# Altium footprint library spider.PcbLib: 53 footprints (part 4 of 4)
Each footprint in its own frame and in the unit in brackets; x right, y up, seen from the top. Pads: shape width x height; smd on the part's side, far side on the other; paste and mask are expansions set on the pad; w line width, h text height; cw(c..) or ccw(c..) is an arc to the next point about the centre after c.
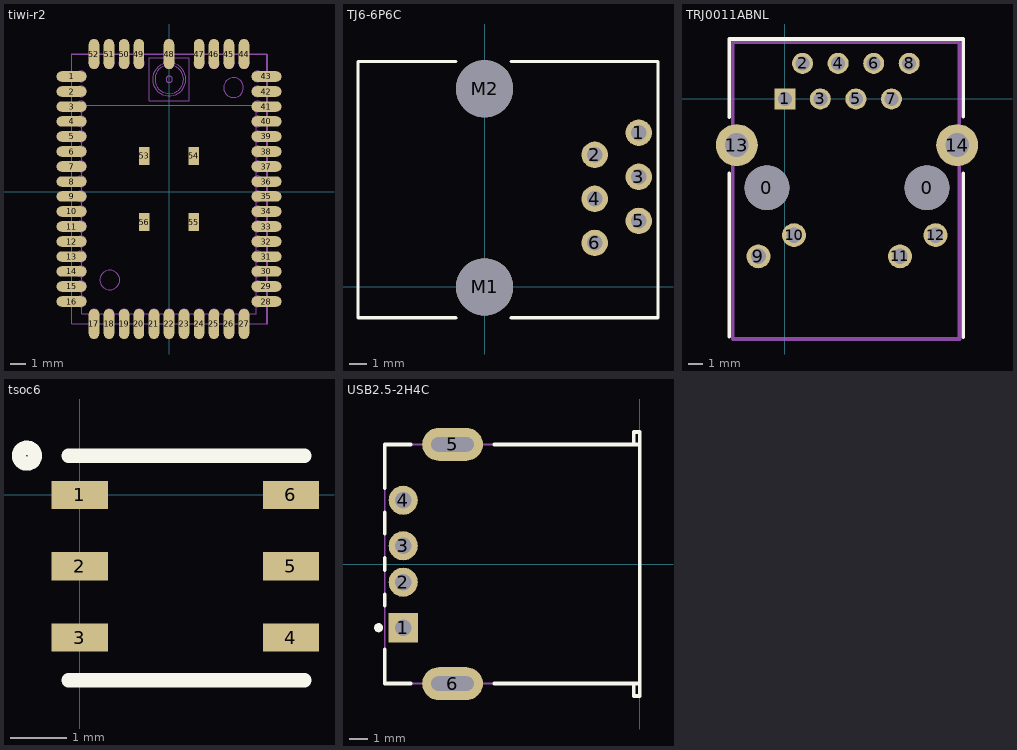
[diagram p3: the footprints below, top view; thin cyan lines are the x and y axes]

## tiwi-r2 [mm]
pads (56):
  oval 2x0.7 smd: 1(-6.533,7.688) 2(-6.533,6.688) 3(-6.533,5.688) 4(-6.533,4.688) 5(-6.533,3.688) 6(-6.533,2.688) 7(-6.533,1.688) 8(-6.533,0.688) 9(-6.533,-0.312) 10(-6.533,-1.312) 11(-6.533,-2.312) 12(-6.533,-3.312) 13(-6.533,-4.312) 14(-6.533,-5.312) 15(-6.533,-6.312) 16(-6.533,-7.312) 28(6.467,-7.312) 29(6.467,-6.312) 30(6.467,-5.312) 31(6.467,-4.312) 32(6.467,-3.312) 33(6.467,-2.312) 34(6.467,-1.312) 35(6.467,-0.312) 36(6.467,0.688) 37(6.467,1.688) 38(6.467,2.688) 39(6.467,3.688) 40(6.467,4.688) 41(6.467,5.688) 42(6.467,6.688) 43(6.467,7.688)
  oval 0.7x2 smd: 17(-5.033,-8.812) 18(-4.033,-8.812) 19(-3.033,-8.812) 20(-2.033,-8.812) 21(-1.033,-8.812) 22(-0.033,-8.812) 23(0.967,-8.812) 24(1.967,-8.812) 25(2.967,-8.812) 26(3.967,-8.812) 27(4.967,-8.812) 44(4.967,9.188) 45(3.967,9.188) 46(2.967,9.188) 47(1.967,9.188) 48(-0.033,9.188) 49(-2.033,9.188) 50(-3.033,9.188) 51(-4.033,9.188) 52(-5.033,9.188)
  rect 0.7x1.2 smd: 53(-1.683,2.388) 54(1.617,2.388) 55(1.617,-2.012) 56(-1.683,-2.012)
Mechanical 1:
  circle w0.025: c-0.017,7.501 r1.111
  circle w0.025: c-0.017,7.501 r0.953
  circle w0.025: c-0.017,7.501 r0.213
  lines w0.025: -6.533,-7.576 ccw(c-6.533,-7.322) -6.533,-7.068 ; -6.533,-6.576 ccw(c-6.533,-6.322) -6.533,-6.068 ; -6.533,-5.576 ccw(c-6.533,-5.322) -6.533,-5.068 ; -6.533,-4.576 ccw(c-6.533,-4.322) -6.533,-4.068 ; -6.533,-3.576 ccw(c-6.533,-3.322) -6.533,-3.068 ; -6.533,-2.576 ccw(c-6.533,-2.322) -6.533,-2.068 ; -6.533,-1.576 ccw(c-6.533,-1.322) -6.533,-1.068 ; -6.533,-0.576 ccw(c-6.533,-0.322) -6.533,-0.068 ; -6.533,0.424 ccw(c-6.533,0.678) -6.533,0.932 ; -6.533,1.424 ccw(c-6.533,1.678) -6.533,1.932 ; -6.533,2.424 ccw(c-6.533,2.678) -6.533,2.932 ; -6.533,3.424 ccw(c-6.533,3.678) -6.533,3.932 ; -6.533,4.424 ccw(c-6.533,4.678) -6.533,4.932 ; -6.533,5.424 ccw(c-6.533,5.678) -6.533,5.932 ; -6.533,6.424 ccw(c-6.533,6.678) -6.533,6.932 ; -6.533,7.424 ccw(c-6.533,7.678) -6.533,7.932 ; -5.297,9.188 ccw(c-5.043,9.188) -4.789,9.188 ; -5.277,-8.812 cw(c-5.023,-8.812) -4.769,-8.812 ; -4.297,9.188 ccw(c-4.043,9.188) -3.789,9.188 ; -4.277,-8.812 cw(c-4.023,-8.812) -3.769,-8.812 ; -3.297,9.188 ccw(c-3.043,9.188) -2.789,9.188 ; -3.277,-8.812 cw(c-3.023,-8.812) -2.769,-8.812 ; -2.297,9.188 ccw(c-2.043,9.188) -1.789,9.188 ; -2.277,-8.812 cw(c-2.023,-8.812) -1.769,-8.812 ; -1.277,-8.812 cw(c-1.023,-8.812) -0.769,-8.812 ; -0.297,9.188 ccw(c-0.043,9.188) 0.211,9.188 ; -0.277,-8.812 cw(c-0.023,-8.812) 0.231,-8.812 ; 0.723,-8.812 cw(c0.977,-8.812) 1.231,-8.812 ; 1.703,9.188 ccw(c1.957,9.188) 2.211,9.188 ; 1.723,-8.812 cw(c1.977,-8.812) 2.231,-8.812 ; 2.703,9.188 ccw(c2.957,9.188) 3.211,9.188 ; 2.723,-8.812 cw(c2.977,-8.812) 3.231,-8.812 ; 3.703,9.188 ccw(c3.957,9.188) 4.211,9.188 ; 3.723,-8.812 cw(c3.977,-8.812) 4.231,-8.812 ; 4.703,9.188 ccw(c4.957,9.188) 5.211,9.188 ; 4.723,-8.812 cw(c4.977,-8.812) 5.231,-8.812 ; 6.567,-7.556 cw(c6.567,-7.302) 6.567,-7.048 ; 6.567,-6.556 cw(c6.567,-6.302) 6.567,-6.048 ; 6.567,-5.556 cw(c6.567,-5.302) 6.567,-5.048 ; 6.567,-4.556 cw(c6.567,-4.302) 6.567,-4.048 ; 6.567,-3.556 cw(c6.567,-3.302) 6.567,-3.048 ; 6.567,-2.556 cw(c6.567,-2.302) 6.567,-2.048 ; 6.567,-1.556 cw(c6.567,-1.302) 6.567,-1.048 ; 6.567,-0.556 cw(c6.567,-0.302) 6.567,-0.048 ; 6.567,0.444 cw(c6.567,0.698) 6.567,0.952 ; 6.567,1.444 cw(c6.567,1.698) 6.567,1.952 ; 6.567,2.444 cw(c6.567,2.698) 6.567,2.952 ; 6.567,3.444 cw(c6.567,3.698) 6.567,3.952 ; 6.567,4.444 cw(c6.567,4.698) 6.567,4.952 ; 6.567,5.444 cw(c6.567,5.698) 6.567,5.952 ; 6.567,6.444 cw(c6.567,6.698) 6.567,6.952 ; 6.567,7.444 cw(c6.567,7.698) 6.567,7.952 ; -6.533,-8.812 6.567,-8.812 6.567,9.188 -6.533,9.188 -6.533,-8.812 ; -5.833,-8.112 5.767,-8.112 5.767,5.788 -5.833,5.788 -5.833,-8.112 ; -1.351,6.072 1.316,6.072 1.316,8.93 -1.351,8.93 -1.351,6.072
  text "MOD1" at 1.286,-0.082 h0.64
Mechanical 10:
  circle w0.025: c-4.023,8.582 r0.356
  circle w0.025: c-5.023,8.582 r0.356
  circle w0.025: c-4.023,-8.178 r0.356
  circle w0.025: c-5.023,-8.178 r0.356
  circle w0.025: c5.857,6.702 r0.356
  circle w0.025: c5.857,4.702 r0.356
  circle w0.025: c5.857,2.702 r0.356
  circle w0.025: c5.857,0.702 r0.356
  circle w0.025: c5.857,-1.298 r0.356
  circle w0.025: c5.857,-3.298 r0.356
  circle w0.025: c5.857,-5.298 r0.356
  circle w0.025: c5.857,-7.298 r0.356
  circle w0.025: c-5.903,-6.298 r0.356
  circle w0.025: c-5.903,-7.298 r0.356
  circle w0.025: c4.272,6.95 r0.66
  circle w0.025: c-3.983,-5.877 r0.66
  circle w0.025: c-5.903,-5.298 r0.356
  circle w0.025: c-5.903,-4.298 r0.356
  circle w0.025: c-5.903,-3.298 r0.356
  circle w0.025: c-5.903,-2.298 r0.356
  circle w0.025: c-5.903,-1.298 r0.356
  circle w0.025: c-5.903,-0.298 r0.356
  circle w0.025: c-5.903,0.702 r0.356
  circle w0.025: c-5.903,1.702 r0.356
  circle w0.025: c-5.903,2.702 r0.356
  circle w0.025: c-5.903,3.702 r0.356
  circle w0.025: c-5.903,4.702 r0.356
  circle w0.025: c-5.903,5.702 r0.356
  circle w0.025: c-5.903,6.702 r0.356
  circle w0.025: c-5.903,7.702 r0.356
  circle w0.025: c5.857,-6.298 r0.356
  circle w0.025: c5.857,-4.298 r0.356
  circle w0.025: c5.857,-2.298 r0.356
  circle w0.025: c5.857,-0.298 r0.356
  circle w0.025: c5.857,1.702 r0.356
  circle w0.025: c5.857,3.702 r0.356
  circle w0.025: c5.857,5.702 r0.356
  circle w0.025: c5.857,7.702 r0.356
  circle w0.025: c-3.023,-8.178 r0.356
  circle w0.025: c-2.023,-8.178 r0.356
  circle w0.025: c-1.023,-8.178 r0.356
  circle w0.025: c-0.023,-8.178 r0.356
  circle w0.025: c0.977,-8.178 r0.356
  circle w0.025: c1.977,-8.178 r0.356
  circle w0.025: c2.977,-8.178 r0.356
  circle w0.025: c3.977,-8.178 r0.356
  circle w0.025: c4.977,-8.178 r0.356
  circle w0.025: c-3.023,8.582 r0.356
  circle w0.025: c-2.023,8.582 r0.356
  circle w0.025: c-0.023,8.582 r0.356
  circle w0.025: c1.977,8.582 r0.356
  circle w0.025: c2.977,8.582 r0.356
  circle w0.025: c3.977,8.582 r0.356
  circle w0.025: c4.977,8.582 r0.356
  lines w0.025: -6.523,-8.798 -6.523,9.202 6.477,9.202 6.477,-8.798 -6.523,-8.798
Mechanical 18:
  lines w0.025: -6.533,-8.812 6.567,-8.812 6.567,9.188 -6.533,9.188 -6.533,-8.812
3D body: height 0.5, standoff 0, extent -6.533,-8.812 6.567,9.188
3D body "tiwi-r2.stp": height 1.87, standoff 0.08, extent -6.483,-8.812 6.517,9.188
3D body: height 1.9, standoff 0, extent -1.042,6.502 0.95,8.498
3D body: height 1.73, standoff 0.5, extent -5.833,-8.112 5.767,5.788

## TJ6-6P6C [mm]
pads (8):
  round 1.524 hole 0.9: 1(8.89,8.89) 2(6.35,7.62) 3(8.89,6.35) 4(6.35,5.08) 5(8.89,3.81) 6(6.35,2.54)
  round 3.3 hole 3.3 unplated: M1(0,0) M2(0,11.43)
Top Overlay:
  lines w0.2: -1.651,-1.778 -1.658,-1.785 -7.3,-1.785 -7.3,13 -1.651,13 ; 1.524,-1.778 1.531,-1.785 10,-1.785 10,13 1.524,13
3D body "User Library-RJ12_54601-906WPLF.STEP": height 11.55, standoff -3.7, extent -7.984,-0.885 10.016,12.315

## TRJ0011ABNL [mm] "TRJ0011ABNL RJ-45 magnet"
height 13.97
pads (16):
  round 3.2 hole 3.2 unplated: 0(-1.27,-6.35) 0(10.16,-6.35)
  rect 1.5x1.5 hole 1: 1(0,0)
  round 1.5 hole 1: 2(1.27,2.54) 3(2.54,0) 4(3.81,2.54) 5(5.08,0) 6(6.35,2.54) 7(7.62,0) 8(8.89,2.54)
  round 1.7 hole 1.1: 9(-1.88,-11.25) 10(0.66,-9.73) 11(8.23,-11.25) 12(10.77,-9.73)
  round 3 hole 1.7: 13(-3.43,-3.3) 14(12.32,-3.3)
Top Overlay:
  lines w0.254: -3.975,-17 -3.975,-5.3 ; -3.975,-1.3 -3.975,4.28 12.75,4.28 12.75,-1.275 ; 12.75,-17.025 12.75,-5.325
Mechanical 15:
  lines w0.254: -3.725,-17.125 -3.725,4.06 12.45,4.06 12.45,-17.075 ; -3.7,-17.15 12.495,-17.15
3D body "40706.stp": height 11.48, standoff -1.58, extent -3.337,-14.51 12.225,4.06

## tsoc6 [mm]
pads (6):
  rect 1x0.5 smd: 1(0,0) 2(0,-1.27) 3(0,-2.54) 4(3.76,-2.54) 5(3.76,-1.27) 6(3.76,0)
Top Overlay:
  circle w0.254: c-0.941,0.7 r0.141
  lines w0.254: -0.2,-3.3 4,-3.3 ; -0.2,0.7 4,0.7
3D body "SW3dPS-TSOC6.STEP": height 1.4, standoff 0, extent -0.2,-3.3 4,0.7

## USB2.5-2H4C [mm] "Connector; USB1.1, Type A, Thru-Hole; 4 Position; Right Angle"
height 7.01
pads (6):
  rect 1.6x1.6 hole 0.92: 1(-12.99,-3.5)
  round 1.6 hole 0.92: 2(-12.99,-1) 3(-12.99,1) 4(-12.99,3.5)
  oval 3.34x1.8 hole 0.8 slot 2.34 at 0 deg: 5(-10.28,6.57) 6(-10.28,-6.57)
Top Overlay:
  circle w0.25: c-14.34,-3.5 r0.125
  lines w0.2: -14,-4.7 -14,-6.565 -12.58,-6.565 ; -14,-2.3 -14,-1.66 ; -14,-0.34 -14,0.34 ; -14,1.66 -14,2.84 ; -14,4.16 -14,6.565 -12.58,6.565 ; -7.98,-6.565 0,-6.565 ; -7.98,6.565 0,6.565 ; -0.32,-6.565 -0.32,-7.25 0,-7.25 0,-6.565 ; -0.32,6.565 -0.32,7.25 0,7.25 0,6.565 ; 0,-6.565 0,6.565
Mechanical 13:
  lines w0.1: -14,-6.565 -14,6.565 -0.32,6.565 -0.32,7.25 0,7.25 0,-7.25 -0.32,-7.25 -0.32,-6.565 -14,-6.565
3D body "Samtec-USB-A-S-S-W-TH.STEP": height 7.55, standoff -3.37, extent -13.973,-7.9 0.127,7.9
3D body: height 7.01, standoff 0, extent -13.999,-7.249 -0.001,7.249